# Altium footprint library MEGAphone.PcbLib: 64 footprints (part 2 of 4)
Each footprint in its own frame and in the unit in brackets; x right, y up, seen from the top. Pads: shape width x height; smd on the part's side, far side on the other; paste and mask are expansions set on the pad; w line width, h text height; cw(c..) or ccw(c..) is an arc to the next point about the centre after c.
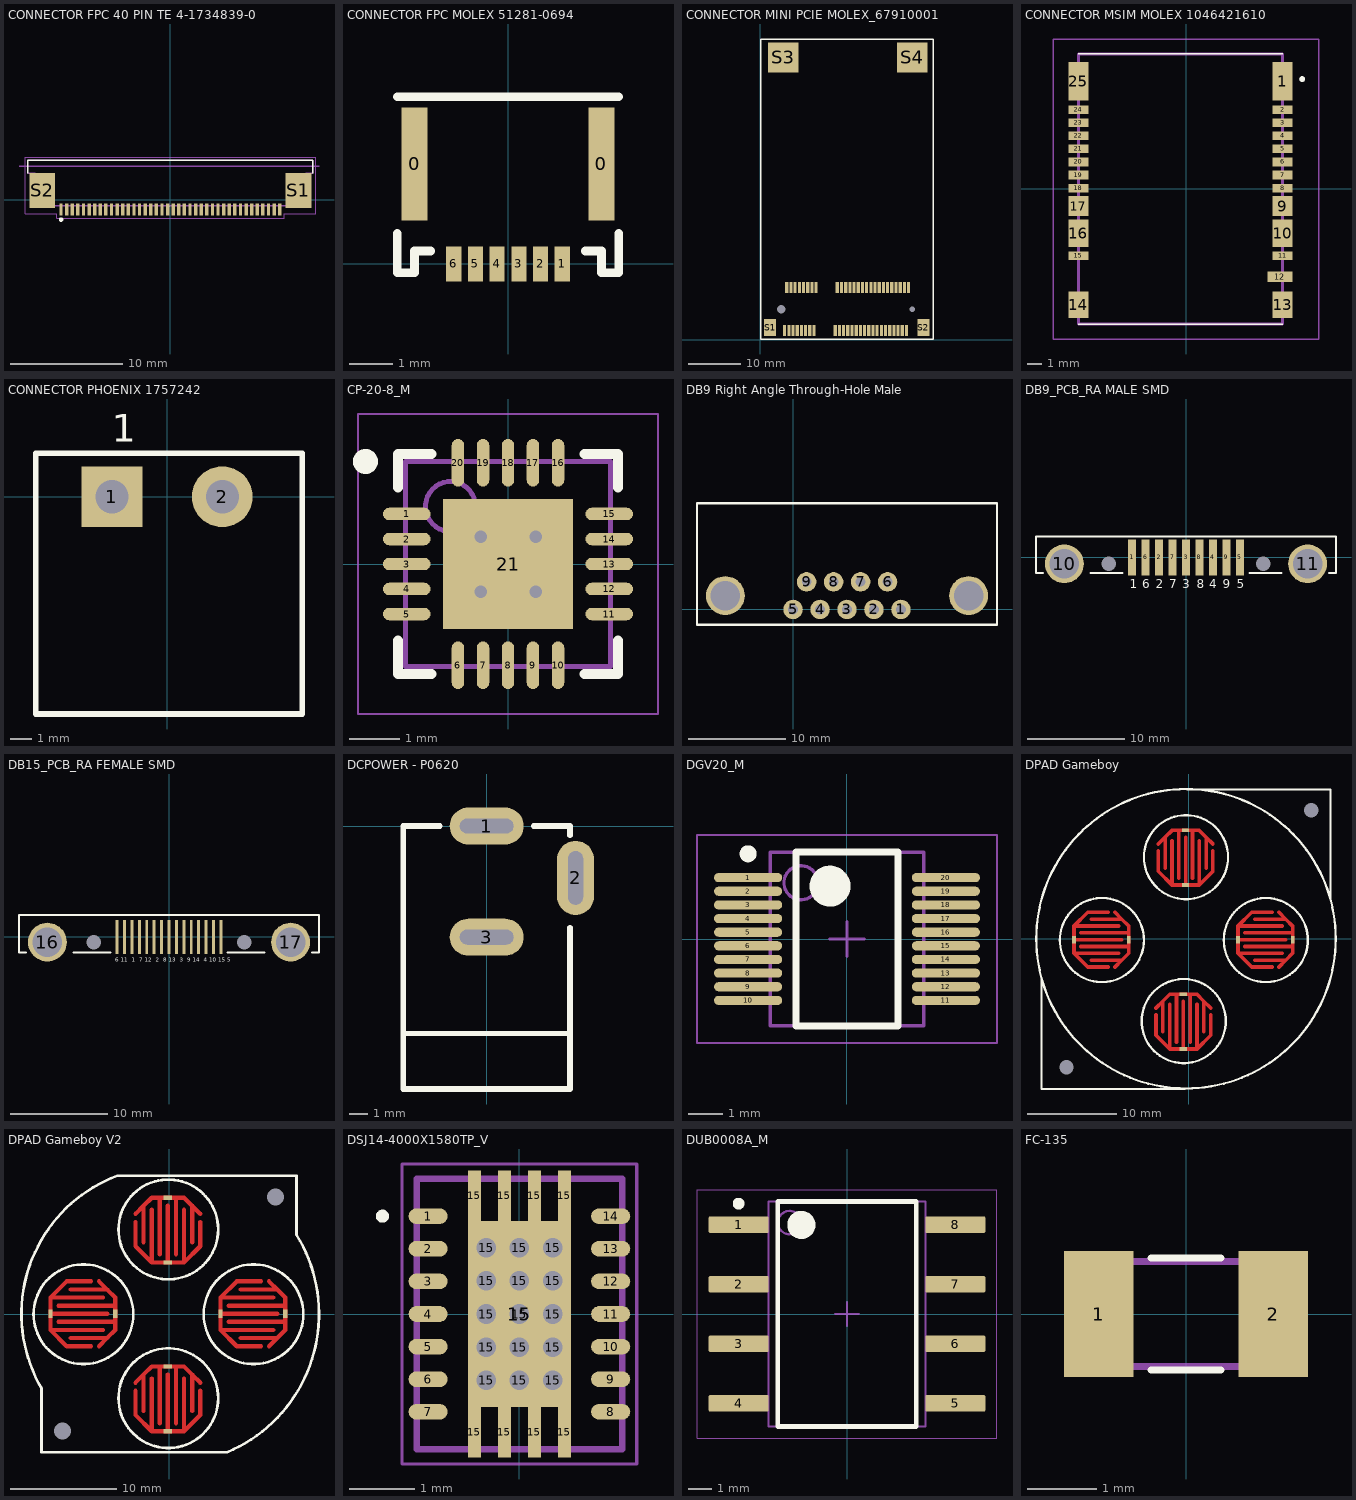
[diagram p1: the footprints below, top view; thin cyan lines are the x and y axes]

## CONNECTOR FPC 40 PIN TE 4-1734839-0 [mm] "40 Position FPC Connector Contacts, Top 0.020\" (0.50mm) Surface Mount, Right Angle"
height 2
pads (42):
  rect 0.3x1.1 smd: 1(-9.75,-0.85) 2(-9.25,-0.85) 3(-8.75,-0.85) 4(-8.25,-0.85) 5(-7.75,-0.85) 6(-7.25,-0.85) 7(-6.75,-0.85) 8(-6.25,-0.85) 9(-5.75,-0.85) 10(-5.25,-0.85) 11(-4.75,-0.85) 12(-4.25,-0.85) 13(-3.75,-0.85) 14(-3.25,-0.85) 15(-2.75,-0.85) 16(-2.25,-0.85) 17(-1.75,-0.85) 18(-1.25,-0.85) 19(-0.75,-0.85) 20(-0.25,-0.85) 21(0.25,-0.85) 22(0.75,-0.85) 23(1.25,-0.85) 24(1.75,-0.85) 25(2.25,-0.85) 26(2.75,-0.85) 27(3.25,-0.85) 28(3.75,-0.85) 29(4.25,-0.85) 30(4.75,-0.85) 31(5.25,-0.85) 32(5.75,-0.85) 33(6.25,-0.85) 34(6.75,-0.85) 35(7.25,-0.85) 36(7.75,-0.85) 37(8.25,-0.85) 38(8.75,-0.85) 39(9.25,-0.85) 40(9.75,-0.85)
  rect 2.3x3.1 smd: S1(11.42,0.85) S2(-11.42,0.85)
Top Overlay:
  circle w0.2: c-9.75,-1.75 r0.1
  lines w0.127: -12.715,2.4 -12.715,3.55 12.715,3.55 12.715,2.4
Mechanical 13:
  lines w0.05: -12.965,-1.25 -12.965,3.8 12.965,3.8 12.965,-1.25 10.15,-1.25 10.15,-1.65 -10.15,-1.65 -10.15,-1.25 -12.965,-1.25
  lines w0.127: -13.5,3 13.25,3 ; -12.715,2.4 -12.06,2.4 -12.06,-0.5 12.06,-0.5 12.06,2.4 12.715,2.4 12.715,3.55 -12.715,3.55
3D body "c-4-1734839-0-c-3d.stp": height 2.05, standoff 0, extent -12.715,-0.85 12.715,4.26

## CONNECTOR FPC MOLEX 51281-0694 [mm] "0.50mm Pitch Easy-On FFC/FPC Connector, Surface Mount, Right-Angle, Non-ZIF, Dual Contact Style, 1.20mm Mated Height, 6 Circuits, Gold (Au) Plating"
height 1.2
pads (8):
  rect 0.6x2.6 smd paste+0 mask+0: 0(-2.15,2.3) 0(2.15,2.3)
  rect 0.35x0.8 smd paste+0 mask+0: 1(1.25,0) 2(0.75,0) 3(0.25,0) 4(-0.25,0) 5(-0.75,0) 6(-1.25,0)
Top Overlay:
  lines w0.2: -2.55,0.7 -2.55,-0.2 -2.15,-0.2 -2.15,0.3 -1.775,0.3 ; -2.55,3.85 2.55,3.85 ; 1.775,0.3 2.15,0.3 2.15,-0.2 2.55,-0.2 2.55,0.7
3D body: height 0.25, standoff 0, extent 3.528,-1.778 3.528,-1.778
3D body "512810694.stp": height 1.2, standoff 0, extent -2.55,-0.2 2.55,3.85

## CONNECTOR MINI PCIE MOLEX_67910001 [mm] "CONN PCI EXP MINI FEMALE 52POS"
height 4
pads (58):
  rect 0.6x2.1 smd paste+0 mask+0: 1(4.676,1.778) 2(5.076,9.978) 3(5.476,1.778) 4(5.876,9.978) 5(6.276,1.778) 6(6.676,9.978) 7(7.076,1.778) 8(7.476,9.978) 9(7.876,1.778) 10(8.276,9.978) 11(8.676,1.778) 12(9.076,9.978) 13(9.476,1.778) 14(9.876,9.978) 15(10.276,1.778) 16(10.676,9.978) 17(14.326,1.778) 18(14.726,9.978) 19(15.126,1.778) 20(15.526,9.978) 21(15.926,1.778) 22(16.326,9.978) 23(16.726,1.778) 24(17.126,9.978) 25(17.526,1.778) 26(17.926,9.978) 27(18.326,1.778) 28(18.726,9.978) 29(19.126,1.778) 30(19.526,9.978) 31(19.926,1.778) 32(20.326,9.978) 33(20.726,1.778) 34(21.126,9.978) 35(21.526,1.778) 36(21.926,9.978) 37(22.326,1.778) 38(22.726,9.978) 39(23.126,1.778) 40(23.526,9.978) 41(23.926,1.778) 42(24.326,9.978) 43(24.726,1.778) 44(25.126,9.978) 45(25.526,1.778) 46(25.926,9.978) 47(26.326,1.778) 48(26.726,9.978) 49(27.126,1.778) 50(27.526,9.978) 51(27.926,1.778) 52(28.326,9.978)
  rect 2.3x3.2 smd paste+0 mask+0: S1(1.876,2.317) S2(31.176,2.317)
  rect 5.8x5.8 smd paste+0 mask+0: S3(4.426,53.867) S4(29.026,53.867)
  round 1 hole 1.6 unplated: ""(4.026,5.817)
  round 0.5 hole 1.1 unplated: ""(29.026,5.817)
Top Overlay:
  lines w0.254: 0.127,0.127 33.02,0.127 33.02,41.021 33.02,57.392 0.127,57.392 0.127,43.307 0.127,0.127
3D body "PCIe-MINI-F1.stp": height 6.37, standoff 1.65, extent 1.6,5.1 31.6,56.05
3D body "679100002.stp": height 4, standoff -0.6, extent 1.55,0.635 31.55,10.835
3D body: height 0.25, standoff 0, extent 15.24,26.289 15.24,26.289

## CONNECTOR MSIM MOLEX 1046421610 [mm] "COMBO 2.10H PULLER TYPE  MICROSD/MICROSIM 8P/8P WITH S/W"
height 2.1
pads (25):
  rect 1.35x2.6 smd: 1(6.5,7.25) 25(-7.25,7.25)
  rect 1.35x0.58 smd: 2(6.5,5.34) 3(6.5,4.46) 4(6.5,3.58) 5(6.5,2.7) 6(6.5,1.82) 7(6.5,0.94) 8(6.5,0.06) 11(6.5,-4.5) 15(-7.25,-4.5) 18(-7.25,0.06) 19(-7.25,0.94) 20(-7.25,1.82) 21(-7.25,2.7) 22(-7.25,3.58) 23(-7.25,4.46) 24(-7.25,5.34)
  rect 1.35x1.34 smd: 9(6.5,-1.15) 17(-7.25,-1.15)
  rect 1.35x1.84 smd: 10(6.5,-2.99) 16(-7.25,-2.99)
  rect 1.7x0.7 smd: 12(6.325,-5.915)
  rect 1.35x1.8 smd: 13(6.5,-7.8) 14(-7.25,-7.8)
Top Overlay:
  lines w0.1: -7.25,-9.1 6.5,-9.1 ; -7.25,9.1 6.5,9.1
  lines w0.2: 7.825,7.3 ccw(c7.825,7.4) 7.825,7.5 ccw(c7.825,7.4) 7.825,7.3
Mechanical 15:
  lines w0.2: -7.25,-9.1 -7.25,9.1 6.5,9.1 6.5,-9.1 -7.25,-9.1
Mechanical 16:
  lines w0.1: -8.925,-10.1 -8.925,10.1 8.925,10.1 8.925,-10.1 -8.925,-10.1
3D body "1046421610.stp": height 2.1, standoff 0, extent -7.4,-9.125 6.7,9.125

## CONNECTOR PHOENIX 1757242 [mm] "HEADER, RIGHT ANGLE, 5.08MM, 2WAY"
height 8.6
pads (2):
  rect 2.8x2.8 hole 1.524: 1(-2.54,0)
  round 2.8 hole 1.524: 2(2.54,0)
Top Overlay:
  lines w0.254: -6.04,-10 -6.04,2 6.21,2 6.21,-10 -6.04,-10
  text "1" at -2.54,2.54 h1.27
3D body "1757242.stp": height 8.6, standoff -3.5, extent -6.08,-10.002 6.08,2

## CP-20-8_M [mm] "QFN, 20-Leads, Body 4x4mm, Pitch 0.5mm, Thermal Pad 2.6x2.6mm, IPC Low Density"
height 0.8
pads (21):
  oval 0.95x0.25 smd: 1(-2.025,1) 2(-2.025,0.5) 3(-2.025,0) 4(-2.025,-0.5) 5(-2.025,-1) 11(2.025,-1) 12(2.025,-0.5) 13(2.025,0) 14(2.025,0.5) 15(2.025,1)
  oval 0.25x0.95 smd: 6(-1,-2.025) 7(-0.5,-2.025) 8(0,-2.025) 9(0.5,-2.025) 10(1,-2.025) 16(1,2.025) 17(0.5,2.025) 18(0,2.025) 19(-0.5,2.025) 20(-1,2.025)
  rect 2.6x2.6 smd: 21(0,0)
via -0.55,0.55 diameter 0.5 hole 0.25
via 0.55,0.55 diameter 0.5 hole 0.25
via -0.55,-0.55 diameter 0.5 hole 0.25
via 0.55,-0.55 diameter 0.5 hole 0.25
Top Overlay:
  circle w0.25: c-2.85,2.05 r0.125
  lines w0.2: -2.2,-1.525 -2.2,-2.2 -1.525,-2.2 ; -2.2,1.525 -2.2,2.2 -1.525,2.2 ; 1.525,-2.2 2.2,-2.2 2.2,-1.525 ; 1.525,2.2 2.2,2.2 2.2,1.525
Mechanical 13:
  circle w0.1: c-1.15,1.15 r0.5
  lines w0.1: -2.05,-2.05 -2.05,2.05 2.05,2.05 2.05,-2.05 -2.05,-2.05
Mechanical 15:
  lines w0.05: -3,-3 -3,3 3,3 3,-3 -3,-3
  lines w0.1: -0.5,0 0.5,0 ; 0,-0.5 0,0.5
3D body: height 0.8, standoff 0, extent -2.05,-2.05 2.05,2.05

## DB9 Right Angle Through-Hole Male [mm] "Assman WSW A-DS 09 A/KG-T2S"
height 12.548
pads (11):
  round 2 hole 1: 1(11.08,0) 2(8.31,0) 3(5.54,0) 4(2.77,0) 5(0,0) 6(9.707,2.84) 7(6.937,2.84) 8(4.167,2.84) 9(1.397,2.84)
  round 4 hole 3.05: ""(-6.955,1.42) ""(18.035,1.42)
Top Overlay:
  lines w0.254: -9.865,-1.58 -9.865,10.92 20.945,10.92 20.945,-1.58 -9.865,-1.58
3D body "connector_a-ds_09_a_kg-t2.stp": height 13.28, standoff -3.6, extent -9.817,-1.451 20.993,17.149

## DB9_PCB_RA MALE SMD [mm] "Norcomp 190-009-263R001"
height 12.55
pads (13):
  round 0.5 hole 1.5: 0(-7.95,-0.65) 0(7.95,-0.65)
  rect 0.8x3.7 smd: 1(-5.54,0) 2(-2.77,0) 3(0,0) 4(2.77,0) 5(5.54,0) 6(-4.155,0) 7(-1.385,0) 8(1.385,0) 9(4.155,0)
  round 4 hole 3.05: 10(-12.495,-0.65) 11(12.495,-0.65)
Top Overlay:
  lines w0.2: -14.7,-1.6 -15.41,-1.6 -15.41,2.15 15.41,2.15 15.41,-1.6 14.7,-1.6 ; -9.8,-1.6 -6.5,-1.6 ; 6.5,-1.6 9.8,-1.6
  text "5" at 5.2,-3.5 h1.52
  text "9" at 3.8,-3.5 h1.52
  text "4" at 2.4,-3.5 h1.52
  text "8" at 1.1,-3.5 h1.52
  text "3" at -0.4,-3.5 h1.52
  text "7" at -1.7,-3.5 h1.52
  text "2" at -3.1,-3.5 h1.52
  text "6" at -4.5,-3.5 h1.52
  text "1" at -5.8,-3.5 h1.52
Mechanical 1:
  region: -6.971,2
3D body "190-009-263.STEP": height 10.79, standoff -3.61, extent -15.43,-1.662 15.431,8.65

## DB15_PCB_RA FEMALE SMD [mm] "Norcomp 200-015-263R001"
height 12.55
pads (19):
  round 0.5 hole 1.5: 0(-7.73,-0.55) 0(7.73,-0.55)
  rect 0.3x3.5 smd: 1(-3.81,0) 2(-1.524,0) 3(0.762,0) 4(3.048,0) 5(5.334,0) 6(-5.334,0) 7(-3.048,0) 8(-0.762,0) 9(1.524,0) 10(3.81,0) 11(-4.572,0) 12(-2.286,0) 13(0,0) 14(2.286,0) 15(4.572,0)
  round 4 hole 3.05: 16(-12.495,-0.55) 17(12.495,-0.55)
Top Overlay:
  lines w0.2: -14.7,-1.6 -15.41,-1.6 -15.41,2.25 15.41,2.25 15.41,-1.6 14.7,-1.6 ; -9.8,-1.6 -6,-1.6 ; 6,-1.6 9.8,-1.6
  text "6 11  1  7 12  2  8 13  3  9 14  4 10 15 5" at -5.5,-2.7 h0.7
Mechanical 1:
  region: -6.971,2
3D body "200-015-263.STEP": height 10.79, standoff -3.61, extent -15.43,-1.575 15.431,8.738

## DCPOWER - P0620 [mm] "2.1mm DC Socket Altronics part P0620"
height 11
pads (3):
  rrect100% 4x2 hole 0.8 slot 2.9 at 0 deg: 1(0,0) 3(0,-6)
  rrect100% 2x4 hole 0.8 slot 2.9 at 90 deg: 2(4.8,-2.8)
Top Overlay:
  lines w0.254: -4.5,-11.2 4.5,-11.2
  lines w0.305: -2.54,0 -4.5,0 -4.5,-14.2 4.5,-14.2 4.5,-5.5 ; 2.54,0 4.5,0 4.5,-0.5
3D body "DC Power Connector.stp": height 11, standoff -4.1, extent -4.446,-14.397 4.954,0.203

## DGV20_M [mm] "TSSOP, 20-Leads, Body 5x4.4mm, Pitch 0.4mm, IPC Low Density"
height 1.2
pads (20):
  oval 2x0.27 smd: 1(-2.9,1.8) 2(-2.9,1.4) 3(-2.9,1) 4(-2.9,0.6) 5(-2.9,0.2) 6(-2.9,-0.2) 7(-2.9,-0.6) 8(-2.9,-1) 9(-2.9,-1.4) 10(-2.9,-1.8) 11(2.9,-1.8) 12(2.9,-1.4) 13(2.9,-1) 14(2.9,-0.6) 15(2.9,-0.2) 16(2.9,0.2) 17(2.9,0.6) 18(2.9,1) 19(2.9,1.4) 20(2.9,1.8)
Top Overlay:
  circle w0.25: c-2.9,2.5 r0.125
  circle w0.6: c-0.5,1.55 r0.3
  lines w0.2: -1.5,-2.55 -1.5,2.55 1.5,2.55 1.5,-2.55 -1.5,-2.55
Mechanical 13:
  circle w0.1: c-1.35,1.65 r0.5
  lines w0.1: -2.25,-2.55 -2.25,2.55 2.25,2.55 2.25,-2.55 -2.25,-2.55
Mechanical 15:
  lines w0.05: -4.4,-3.05 -4.4,3.05 4.4,3.05 4.4,-3.05 -4.4,-3.05
  lines w0.1: -0.5,0 0.5,0 ; 0,-0.5 0,0.5
3D body: height 1.2, standoff 0.05, extent -2.25,-2.55 2.25,2.55

## DPAD Gameboy [mil]
pads (10):
  round 0 hole 62.99: 0(-537.5,-565) 0(537.5,565)
  rect 32x16 smd paste-118.11: 1(-14.26,475.84) 4(-24.26,-244.16) 5(-24.26,-484.16) 8(-14.26,235.84)
  rect 16x32 smd paste-118.11: 2(-504.26,-4.16) 3(215.74,-4.16) 6(455.74,-4.16) 7(-264.26,-4.16)
Top Layer:
  lines w16: -474.26,-34.16 -264.26,-34.16 ; -474.26,25.84 -264.26,25.84 ; -429.26,-94.16 -294.26,-94.16 ; -429.26,85.84 -294.26,85.84 ; -354.26,-124.16 -444.26,-124.16 -504.26,-64.16 ; -354.26,115.84 -444.26,115.84 -504.26,55.84 ; -324.26,-124.16 -294.26,-94.16 ; -324.26,115.84 -294.26,85.84 ; -309.26,-64.16 -504.26,-64.16 ; -309.26,55.84 -504.26,55.84 ; -294.26,-4.16 -504.26,-4.16 ; -144.26,-334.16 -144.26,-423.3 -144.26,-424.16 -84.26,-484.16 ; -144.26,-304.16 -114.26,-274.16 ; -134.26,385.84 -134.26,295.84 -74.26,235.84 ; -134.26,415.84 -104.26,445.84 ; -114.26,-409.16 -114.26,-274.16 ; -104.26,310.84 -104.26,445.84 ; -84.26,-289.16 -84.26,-484.16 ; -74.26,430.84 -74.26,235.84 ; -54.26,-454.16 -54.26,-244.16 ; -44.26,265.84 -44.26,475.84 ; -24.26,-274.16 -24.26,-484.16 ; -14.26,445.84 -14.26,235.84 ; 5.74,-454.16 5.74,-244.16 ; 15.74,265.84 15.74,475.84 ; 35.74,-289.16 35.74,-484.16 ; 45.74,430.84 45.74,235.84 ; 65.74,-409.16 65.74,-274.16 ; 75.74,310.84 75.74,445.84 ; 95.74,-334.16 95.74,-424.16 35.74,-484.16 ; 95.74,-304.16 65.74,-274.16 ; 105.74,385.84 105.74,295.84 45.74,235.84 ; 105.74,415.84 75.74,445.84 ; 245.74,-34.16 455.74,-34.16 ; 245.74,25.84 455.74,25.84 ; 290.74,-94.16 425.74,-94.16 ; 290.74,85.84 425.74,85.84 ; 365.74,-124.16 275.74,-124.16 215.74,-64.16 ; 365.74,115.84 275.74,115.84 215.74,55.84 ; 395.74,-124.16 425.74,-94.16 ; 395.74,115.84 425.74,85.84 ; 410.74,-64.16 215.74,-64.16 ; 410.74,55.84 215.74,55.84 ; 425.74,-4.16 215.74,-4.16 ; -504.26,-64.16 -504.26,-4.16 ; -504.26,-4.16 -504.26,55.84 ; -294.26,-94.16 -264.26,-64.16 -264.26,-34.16 ; -294.26,85.84 -264.26,55.84 -264.26,25.84 ; -264.26,-34.16 -264.26,-8.02 -264.26,-4.16 -264.26,25.84 ; -114.26,-274.16 -84.26,-244.16 -54.26,-244.16 ; -104.26,445.84 -74.26,475.84 -44.26,475.84 ; -84.26,-484.16 -24.26,-484.16 ; -74.26,235.84 -14.26,235.84 ; -54.26,-244.16 -24.26,-244.16 5.74,-244.16 ; -44.26,475.84 -14.26,475.84 15.74,475.84 ; -24.26,-484.16 35.74,-484.16 ; -14.26,235.84 45.74,235.84 ; 5.74,-244.16 35.74,-244.16 65.74,-274.16 ; 15.74,475.84 45.74,475.84 75.74,445.84 ; 215.74,-64.16 215.74,-4.16 ; 215.74,-4.16 215.74,55.84 ; 425.74,-94.16 455.74,-64.16 455.74,-34.16 ; 425.74,85.84 455.74,55.84 455.74,25.84 ; 455.74,-34.16 455.74,-4.16 455.74,25.84
Top Overlay:
  circle w10: c-12.5,0 r657.65
  circle w10: c-22.51,-361.79 r184.69
  circle w10: c338.11,-5.91 r184.69
  circle w10: c-12.51,358.21 r184.69
  circle w10: c-381.89,-5.91 r184.69
  lines w10: -647.5,-175 -647.5,-660 -17.5,-660 ; -7.5,655 622.5,655 622.5,175
Top Solder:
  circle w177.17: c-381.89,-5.91 r78.74
  circle w177.17: c-22.51,-361.79 r78.74
  circle w177.17: c338.11,-5.91 r78.74
  circle w177.17: c-12.51,358.21 r78.74

## DPAD Gameboy V2 [mil]
pads (10):
  round 0 hole 62.99: 0(-393.7,-433.07) 0(393.7,433.07)
  rect 32x16 smd paste-118.11: 1(-4.26,430.84) 4(-4.26,-194.16) 5(-4.26,-434.16) 8(-4.26,190.84)
  rect 16x32 smd paste-118.11: 2(-439.26,0.84) 3(190.74,0.84) 6(430.74,0.84) 7(-199.26,0.84)
Top Layer:
  lines w16: -409.26,-29.16 -199.26,-29.16 ; -409.26,30.84 -199.26,30.84 ; -364.26,-89.16 -229.26,-89.16 ; -364.26,90.84 -229.26,90.84 ; -289.26,-119.16 -379.26,-119.16 -439.26,-59.16 ; -289.26,120.84 -379.26,120.84 -439.26,60.84 ; -259.26,-119.16 -229.26,-89.16 ; -259.26,120.84 -229.26,90.84 ; -244.26,-59.16 -439.26,-59.16 ; -244.26,60.84 -439.26,60.84 ; -229.26,0.84 -439.26,0.84 ; -124.26,-284.16 -124.26,-373.3 -124.26,-374.16 -64.26,-434.16 ; -124.26,-254.16 -94.26,-224.16 ; -124.26,340.84 -124.26,250.84 -64.26,190.84 ; -124.26,370.84 -94.26,400.84 ; -94.26,-359.16 -94.26,-224.16 ; -94.26,265.84 -94.26,400.84 ; -64.26,-239.16 -64.26,-434.16 ; -64.26,385.84 -64.26,190.84 ; -34.26,-404.16 -34.26,-194.16 ; -34.26,220.84 -34.26,430.84 ; -4.26,-224.16 -4.26,-434.16 ; -4.26,400.84 -4.26,190.84 ; 25.74,-404.16 25.74,-194.16 ; 25.74,220.84 25.74,430.84 ; 55.74,-239.16 55.74,-434.16 ; 55.74,385.84 55.74,190.84 ; 85.74,-359.16 85.74,-224.16 ; 85.74,265.84 85.74,400.84 ; 115.74,-284.16 115.74,-374.16 55.74,-434.16 ; 115.74,-254.16 85.74,-224.16 ; 115.74,340.84 115.74,250.84 55.74,190.84 ; 115.74,370.84 85.74,400.84 ; 220.74,-29.16 430.74,-29.16 ; 220.74,30.84 430.74,30.84 ; 265.74,-89.16 400.74,-89.16 ; 265.74,90.84 400.74,90.84 ; 340.74,-119.16 250.74,-119.16 190.74,-59.16 ; 340.74,120.84 250.74,120.84 190.74,60.84 ; 370.74,-119.16 400.74,-89.16 ; 370.74,120.84 400.74,90.84 ; 385.74,-59.16 190.74,-59.16 ; 385.74,60.84 190.74,60.84 ; 400.74,0.84 190.74,0.84 ; -439.26,-59.16 -439.26,0.84 ; -439.26,0.84 -439.26,60.84 ; -229.26,-89.16 -199.26,-59.16 -199.26,-29.16 ; -229.26,90.84 -199.26,60.84 -199.26,30.84 ; -199.26,-29.16 -199.26,-3.02 -199.26,0.84 -199.26,30.84 ; -94.26,-224.16 -64.26,-194.16 -34.26,-194.16 ; -94.26,400.84 -64.26,430.84 -34.26,430.84 ; -64.26,-434.16 -4.26,-434.16 ; -64.26,190.84 -4.26,190.84 ; -34.26,-194.16 -4.26,-194.16 25.74,-194.16 ; -34.26,430.84 -4.26,430.84 25.74,430.84 ; -4.26,-434.16 55.74,-434.16 ; -4.26,190.84 55.74,190.84 ; 25.74,-194.16 55.74,-194.16 85.74,-224.16 ; 25.74,430.84 55.74,430.84 85.74,400.84 ; 190.74,-59.16 190.74,0.84 ; 190.74,0.84 190.74,60.84 ; 400.74,-89.16 430.74,-59.16 430.74,-29.16 ; 400.74,90.84 430.74,60.84 430.74,30.84 ; 430.74,-29.16 430.74,0.84 430.74,30.84
Top Overlay:
  circle w10: c-2.51,-311.79 r184.69
  circle w10: c313.11,-0.91 r184.69
  circle w10: c-2.51,313.21 r184.69
  circle w10: c-316.89,-0.91 r184.69
  lines w10: -472.44,-276.03 -472.44,-511.81 0,-511.81 215.84,-511.81 ; -471.75,-276.03 cw(c0,0) -191.81,511.81 0,511.81 472.44,511.81 472.44,292.44 cw(c0,0) 215.84,-511.99
Top Solder:
  circle w177.17: c-316.89,-0.91 r78.74
  circle w177.17: c-2.51,-311.79 r78.74
  circle w177.17: c313.11,-0.91 r78.74
  circle w177.17: c-2.51,313.21 r78.74

## DSJ14-4000X1580TP_V [mm] "SON, 14-Leads, Body 4.15x3.15mm, Pitch 0.5mm"
height 1
pads (38):
  oval 0.6x0.24 smd mask+0.07: 1(-1.4,1.5) 2(-1.4,1) 3(-1.4,0.5) 4(-1.4,0) 5(-1.4,-0.5) 6(-1.4,-1) 7(-1.4,-1.5) 8(1.4,-1.5) 9(1.4,-1) 10(1.4,-0.5) 11(1.4,0) 12(1.4,0.5) 13(1.4,1) 14(1.4,1.5)
  rect 0.2x0.775 smd: 15(-0.69,-1.813) 15(-0.69,1.813) 15(-0.23,-1.813) 15(-0.23,1.813) 15(0.23,-1.813) 15(0.23,1.813) 15(0.69,-1.813) 15(0.69,1.813)
  round 0.3 hole 0.3: 15(-0.508,-1.016) 15(-0.508,-0.508) 15(-0.508,0) 15(-0.508,0.508) 15(-0.508,1.016) 15(0,-1.016) 15(0,-0.508) 15(0,0) 15(0,0.508) 15(0,1.016) 15(0.508,-1.016) 15(0.508,-0.508) 15(0.508,0) 15(0.508,0.508) 15(0.508,1.016)
  rect 1.58x2.85 smd paste-1: 15(0,0)
Top Overlay:
  circle w0.1: c-2.1,1.5 r0.05
Top Paste:
  region: 0.13,0.1 0.13,2.2 0.33,2.2 0.33,1.425 0.59,1.425 0.59,2.2 0.79,2.2 0.79,0.1
  region: -0.13,0.1 -0.13,2.2 -0.33,2.2 -0.33,1.425 -0.59,1.425 -0.59,2.2 -0.79,2.2 -0.79,0.1
  region: 0.13,-0.1 0.13,-2.2 0.33,-2.2 0.33,-1.425 0.59,-1.425 0.59,-2.2 0.79,-2.2 0.79,-0.1
  region: -0.13,-0.1 -0.13,-2.2 -0.33,-2.2 -0.33,-1.425 -0.59,-1.425 -0.59,-2.2 -0.79,-2.2 -0.79,-0.1
Mechanical 13:
  lines w0.1: -1.575,-2.075 1.575,-2.075 1.575,2.075 -1.575,2.075 -1.575,-2.075
Mechanical 15:
  lines w0.05: -1.8,-2.3 1.8,-2.3 1.8,2.3 -1.8,2.3 -1.8,-2.3
  lines w0.1: -0.5,0 0.5,0 ; 0,-0.5 0,0.5
3D body "SON50P300X100_HS-15L.step": height 1, standoff 0, extent -1.575,-2.075 1.575,2.075

## DUB0008A_M [mm] "SOP, 8-Leads, Body 6.7x9.6mm, Pitch 2.54mm, IPC Low Density"
height 4.85
pads (8):
  rrect14% 2.55x0.7 smd: 1(-4.625,3.81) 2(-4.625,1.27) 3(-4.625,-1.27) 4(-4.625,-3.81) 5(4.625,-3.81) 6(4.625,-1.27) 7(4.625,1.27) 8(4.625,3.81)
Top Overlay:
  circle w0.6: c-1.95,3.8 r0.3
  circle w0.25: c-4.625,4.71 r0.125
  lines w0.2: -2.95,-4.8 2.95,-4.8 2.95,4.8 -2.95,4.8 -2.95,-4.8
Mechanical 13:
  circle w0.1: c-2.45,3.9 r0.5
  lines w0.1: -3.35,-4.8 3.35,-4.8 3.35,4.8 -3.35,4.8 -3.35,-4.8
Mechanical 15:
  lines w0.05: -6.4,-5.3 6.4,-5.3 6.4,5.3 -6.4,5.3 -6.4,-5.3
  lines w0.1: -0.5,0 0.5,0 ; 0,-0.5 0,0.5
3D body "DUB0008A.stp": height 4.85, standoff 0, extent -5.242,-4.75 5.242,4.75

## FC-135 [mm] "Low profile SMD crystal"
height 0.8
pads (2):
  rect 1x1.8 smd: 1(-1.25,0) 2(1.25,0)
Top Overlay:
  lines w0.1: -0.5,-0.8 0,-0.8 0.5,-0.8 ; -0.5,0.8 0,0.8 0.5,0.8
Mechanical 13:
  lines w0.1: -1.6,-0.75 -1.6,0 -1.6,0.75 1.6,0.75 1.6,0 1.6,-0.75 -1.6,-0.75
3D body: height 0.8, standoff 0, extent -1.599,-0.749 1.599,0.749